# Altium integrated library Connectors.IntLib: 512 symbols (part 2 of 2)
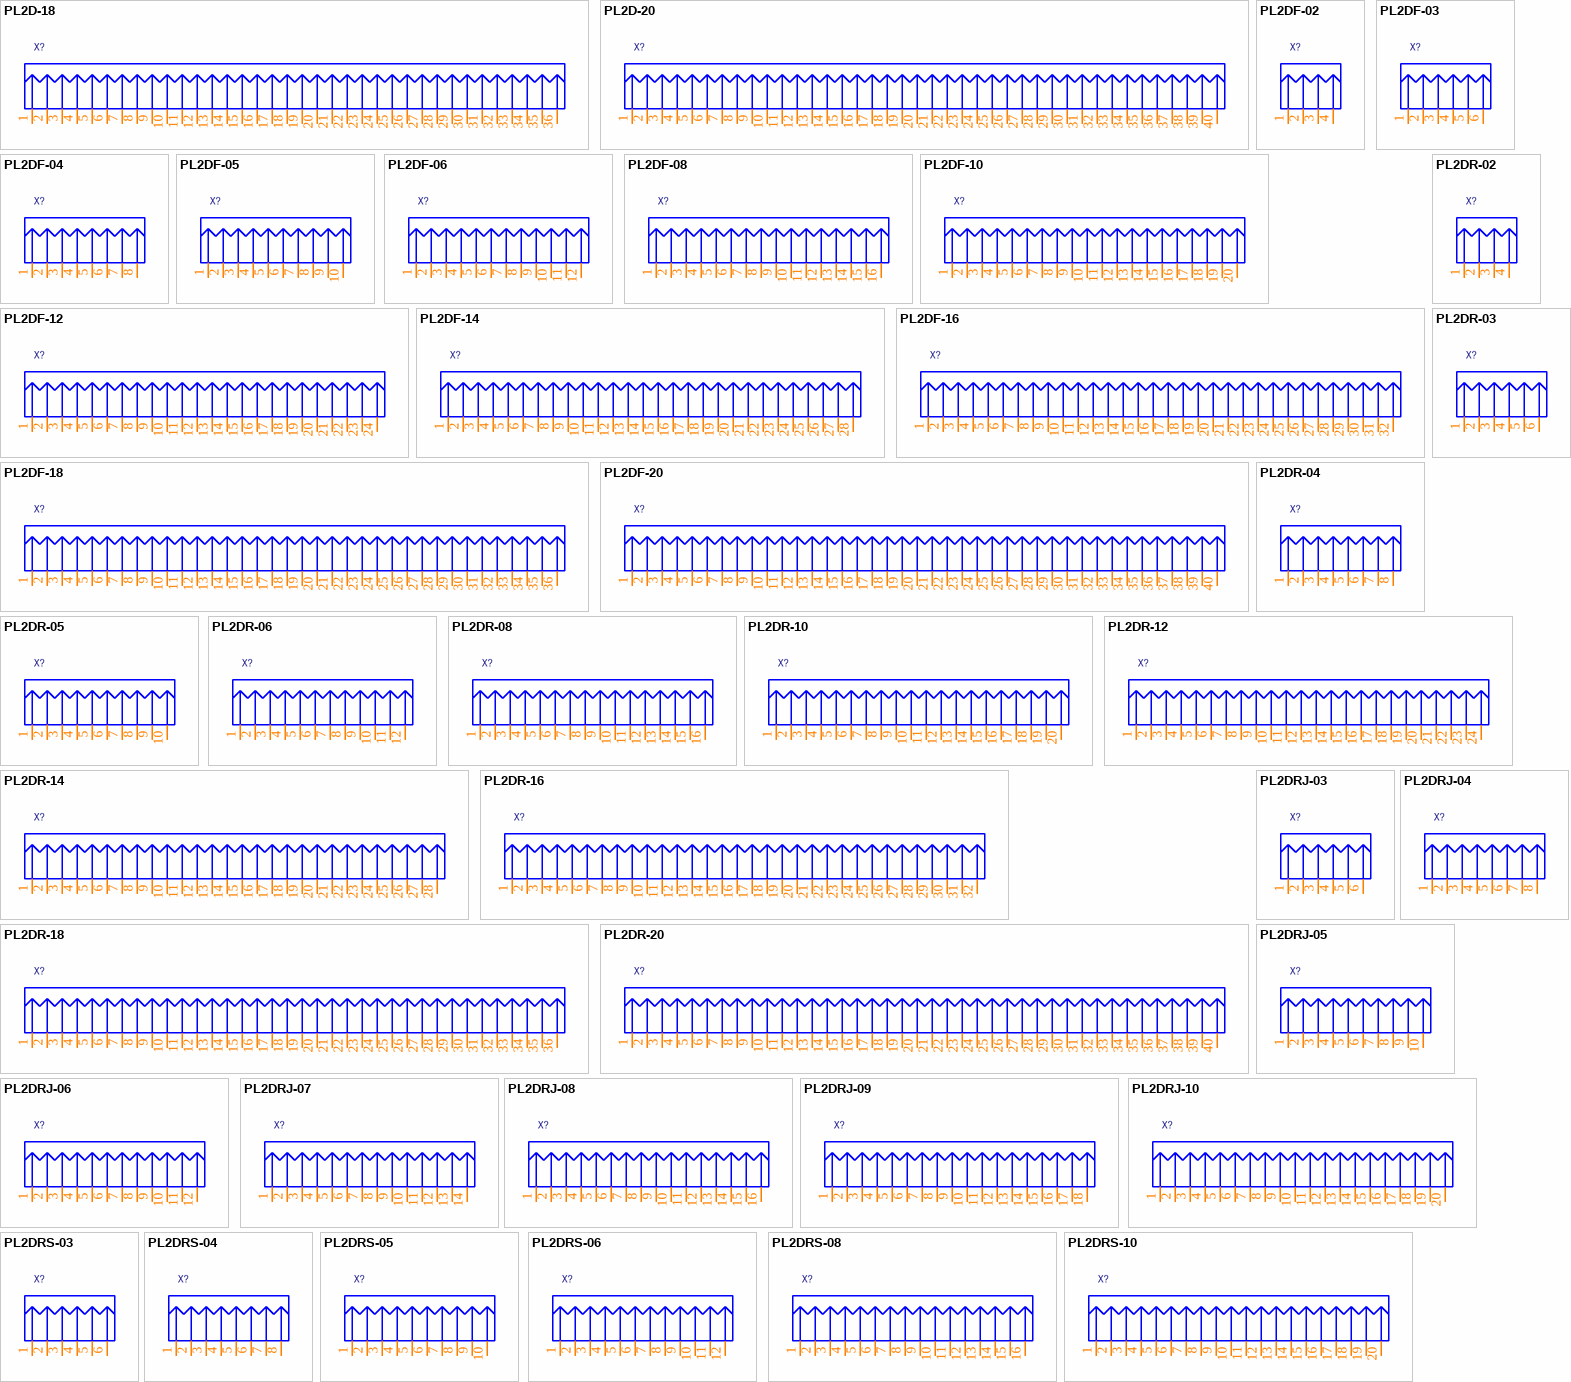
[diagram p14: symbols PL2D-18 to PL2DRS-10]

## PL2DRS-08
designator X?  (value not drawn)
2.0 mm; Note: Connector; Temp.Characteristic: -40C to +85C; Publisher: Catcatcat Electronics; Manufacturer: http://www.jinlingdz.com; Website developer: http://catcatcat.d-lan.dp.ua/; Assembly type: Manual Part
footprint PL2DRS-08 (2.00 mm)
pins: 1, 2, 3, 4, 5, 6, 7, 8, 9, 10, 11, 12, 13, 14, 15, 16

## PL2DRS-10
designator X?  (value not drawn)
2.0 mm; Note: Connector; Temp.Characteristic: -40C to +85C; Publisher: Catcatcat Electronics; Manufacturer: http://www.jinlingdz.com; Website developer: http://catcatcat.d-lan.dp.ua/; Assembly type: Manual Part
footprint PL2DRS-10 (2.00 mm)
pins: 1, 2, 3, 4, 5, 6, 7, 8, 9, 10, 11, 12, 13, 14, 15, 16, 17, 18, 19, 20

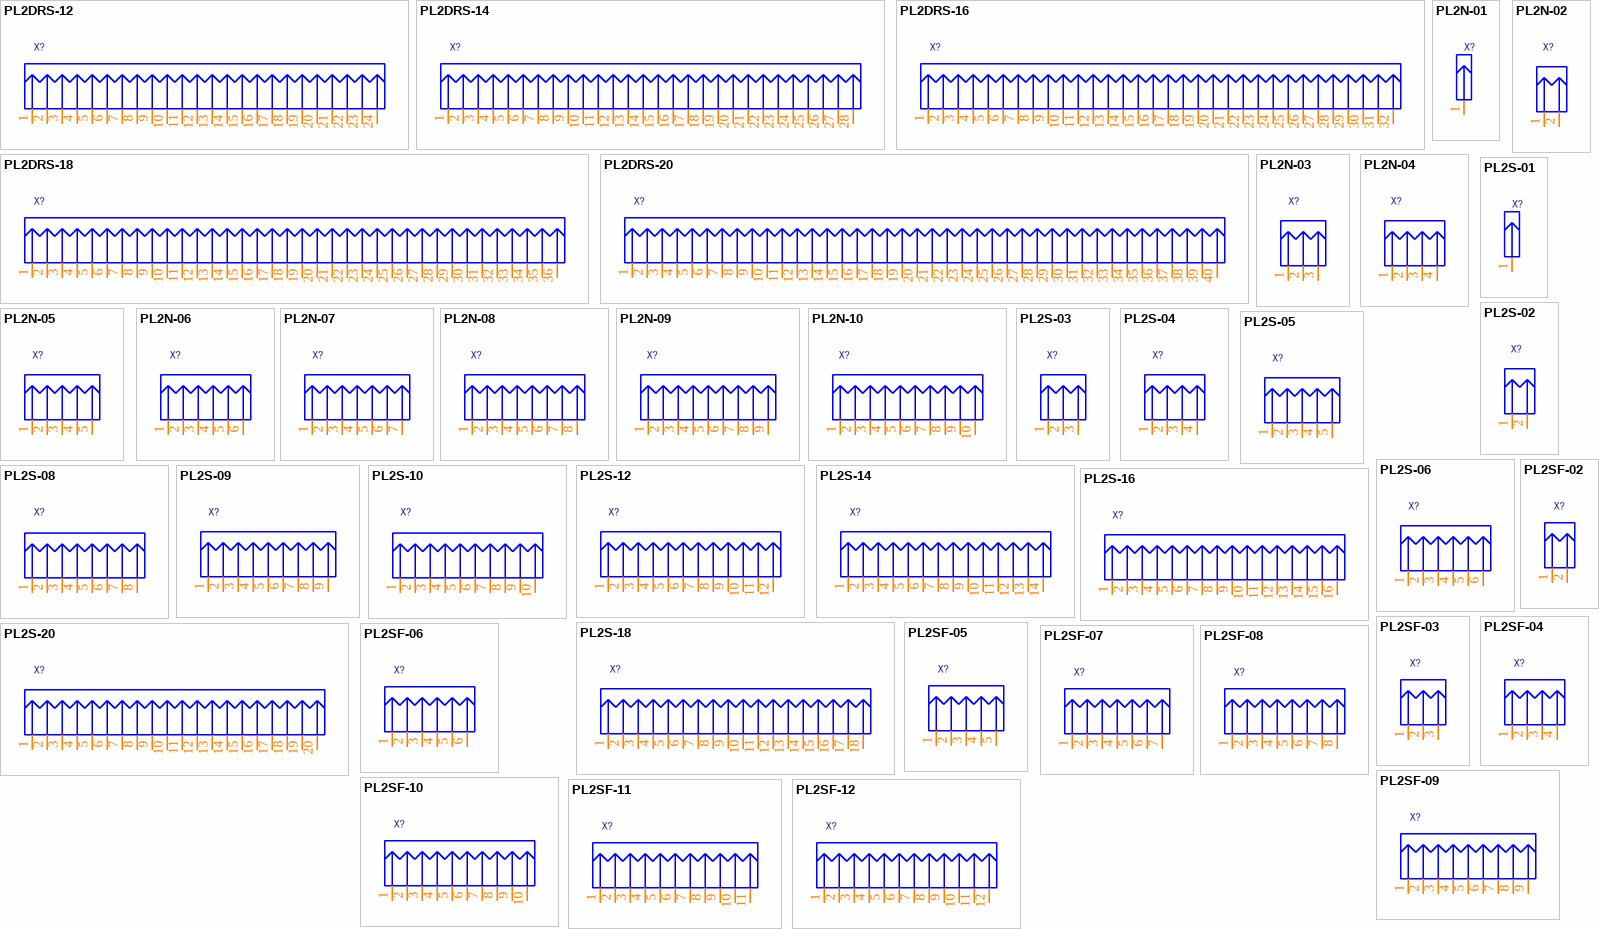
[diagram p7: symbols PL2DRS-12 to PL2SF-12]

## PL2DRS-12
designator X?  (value not drawn)
2.0 mm; Note: Connector; Temp.Characteristic: -40C to +85C; Publisher: Catcatcat Electronics; Manufacturer: http://www.jinlingdz.com; Website developer: http://catcatcat.d-lan.dp.ua/; Assembly type: Manual Part
footprint PL2DRS-12 (2.00 mm)
pins: 1, 2, 3, 4, 5, 6, 7, 8, 9, 10, 11, 12, 13, 14, 15, 16, 17, 18, 19, 20, 21, 22, 23, 24

## PL2DRS-14
designator X?  (value not drawn)
2.0 mm; Note: Connector; Temp.Characteristic: -40C to +85C; Publisher: Catcatcat Electronics; Manufacturer: http://www.jinlingdz.com; Website developer: http://catcatcat.d-lan.dp.ua/; Assembly type: Manual Part
footprint PL2DRS-14 (2.00 mm)
pins: 1, 2, 3, 4, 5, 6, 7, 8, 9, 10, 11, 12, 13, 14, 15, 16, 17, 18, 19, 20, 21, 22, 23, 24, 25, 26, 27, 28

## PL2DRS-16
designator X?  (value not drawn)
2.0 mm; Note: Connector; Temp.Characteristic: -40C to +85C; Publisher: Catcatcat Electronics; Manufacturer: http://www.jinlingdz.com; Website developer: http://catcatcat.d-lan.dp.ua/; Assembly type: Manual Part
footprint PL2DRS-16 (2.00 mm)
pins: 1, 2, 3, 4, 5, 6, 7, 8, 9, 10, 11, 12, 13, 14, 15, 16, 17, 18, 19, 20, 21, 22, 23, 24, 25, 26, 27, 28, 29, 30, 31, 32

## PL2DRS-18
designator X?  (value not drawn)
2.0 mm; Note: Connector; Temp.Characteristic: -40C to +85C; Publisher: Catcatcat Electronics; Manufacturer: http://www.jinlingdz.com; Website developer: http://catcatcat.d-lan.dp.ua/; Assembly type: Manual Part
footprint PL2DRS-18 (2.00 mm)
pins: 1, 2, 3, 4, 5, 6, 7, 8, 9, 10, 11, 12, 13, 14, 15, 16, 17, 18, 19, 20, 21, 22, 23, 24, 25, 26, 27, 28, 29, 30, 31, 32, 33, 34, 35, 36

## PL2DRS-20
designator X?  (value not drawn)
2.0 mm; Note: Connector; Temp.Characteristic: -40C to +85C; Publisher: Catcatcat Electronics; Manufacturer: http://www.jinlingdz.com; Website developer: http://catcatcat.d-lan.dp.ua/; Assembly type: Manual Part
footprint PL2DRS-20 (2.00 mm)
pins: 1, 2, 3, 4, 5, 6, 7, 8, 9, 10, 11, 12, 13, 14, 15, 16, 17, 18, 19, 20, 21, 22, 23, 24, 25, 26, 27, 28, 29, 30, 31, 32, 33, 34, 35, 36, 37, 38, 39, 40

## PL2N-01
designator X?  (value not drawn)
2.0 mm; Value: 5*2mm; Pricing Аlternative: 0; Note: Connector; Temp.Characteristic: -40C to +85C; Pricing Digi-Key: 0; Publisher: Catcatcat Electronics; Manufacturer: http://www.jinlingdz.com; Website developer: http://catcatcat.d-lan.dp.ua/; Assembly type: Manual Part
footprint PL2N-01 (2.00 mm)
pins: 1

## PL2N-02
designator X?  (value not drawn)
2.0 mm; Value: 5*2mm; Pricing Аlternative: 0; Note: Connector; Temp.Characteristic: -40C to +85C; Pricing Digi-Key: 0; Publisher: Catcatcat Electronics; Manufacturer: http://www.jinlingdz.com; Website developer: http://catcatcat.d-lan.dp.ua/; Assembly type: Manual Part
footprint PL2N-02 (2.00 mm)
pins: 1, 2

## PL2N-03
designator X?  (value not drawn)
2.0 mm; Value: 5*2mm; Pricing Аlternative: 0; Note: Connector; Temp.Characteristic: -40C to +85C; Pricing Digi-Key: 0; Publisher: Catcatcat Electronics; Manufacturer: http://www.jinlingdz.com; Website developer: http://catcatcat.d-lan.dp.ua/; Assembly type: Manual Part
footprint PL2N-03 (2.00 mm)
pins: 1, 2, 3

## PL2N-04
designator X?  (value not drawn)
2.0 mm; Value: 5*2mm; Pricing Аlternative: 0; Note: Connector; Temp.Characteristic: -40C to +85C; Pricing Digi-Key: 0; Publisher: Catcatcat Electronics; Manufacturer: http://www.jinlingdz.com; Website developer: http://catcatcat.d-lan.dp.ua/; Assembly type: Manual Part
footprint PL2N-05 (2.00 mm)
pins: 1, 2, 3, 4

## PL2N-05
designator X?  (value not drawn)
2.0 mm; Value: 5*2mm; Pricing Аlternative: 0; Note: Connector; Temp.Characteristic: -40C to +85C; Pricing Digi-Key: 0; Publisher: Catcatcat Electronics; Manufacturer: http://www.jinlingdz.com; Website developer: http://catcatcat.d-lan.dp.ua/; Assembly type: Manual Part
footprint PL2N-05 (2.00 mm)
pins: 1, 2, 3, 4, 5

## PL2N-06
designator X?  (value not drawn)
2.0 mm; Note: Connector; Temp.Characteristic: -40C to +85C; Publisher: Catcatcat Electronics; Manufacturer: http://www.jinlingdz.com; Website developer: http://catcatcat.d-lan.dp.ua/; Assembly type: Manual Part
footprint PL2N-06 (2.00 mm)
pins: 1, 2, 3, 4, 5, 6

## PL2N-07
designator X?  (value not drawn)
2.0 mm; Note: Connector; Temp.Characteristic: -40C to +85C; Publisher: Catcatcat Electronics; Manufacturer: http://www.jinlingdz.com; Website developer: http://catcatcat.d-lan.dp.ua/; Assembly type: Manual Part
footprint PL2N-07 (2.00 mm)
pins: 1, 2, 3, 4, 5, 6, 7

## PL2N-08
designator X?  (value not drawn)
2.0 mm; Note: Connector; Temp.Characteristic: -40C to +85C; Publisher: Catcatcat Electronics; Manufacturer: http://www.jinlingdz.com; Website developer: http://catcatcat.d-lan.dp.ua/; Assembly type: Manual Part
footprint PL2N-08 (2.00 mm)
pins: 1, 2, 3, 4, 5, 6, 7, 8

## PL2N-09
designator X?  (value not drawn)
2.0 mm; Note: Connector; Temp.Characteristic: -40C to +85C; Publisher: Catcatcat Electronics; Manufacturer: http://www.jinlingdz.com; Website developer: http://catcatcat.d-lan.dp.ua/; Assembly type: Manual Part
footprint PL2N-09 (2.00 mm)
pins: 1, 2, 3, 4, 5, 6, 7, 8, 9

## PL2N-10
designator X?  (value not drawn)
2.0 mm; Note: Connector; Temp.Characteristic: -40C to +85C; Publisher: Catcatcat Electronics; Manufacturer: http://www.jinlingdz.com; Website developer: http://catcatcat.d-lan.dp.ua/; Assembly type: Manual Part
footprint PL2N-10 (2.00 mm)
pins: 1, 2, 3, 4, 5, 6, 7, 8, 9, 10

## PL2S-01
designator X?  (value not drawn)
2.0 mm; Value: 5*2mm; Pricing Аlternative: 0; Note: Connector; Temp.Characteristic: -40C to +85C; Pricing Digi-Key: 0; Publisher: Catcatcat Electronics; Manufacturer: http://www.jinlingdz.com; Website developer: http://catcatcat.d-lan.dp.ua/; Assembly type: Manual Part
footprint PL2S-01 (2.00 mm)
pins: 1

## PL2S-02
designator X?  (value not drawn)
2.0 mm; Value: 5*2mm; Pricing Аlternative: 0; Note: Connector; Temp.Characteristic: -40C to +85C; Pricing Digi-Key: 0; Publisher: Catcatcat Electronics; Manufacturer: http://www.jinlingdz.com; Website developer: http://catcatcat.d-lan.dp.ua/; Assembly type: Manual Part
footprint PL2S-02 (2.00 mm)
pins: 1, 2

## PL2S-03
designator X?  (value not drawn)
2.0 mm; Value: 5*2mm; Pricing Аlternative: 0; Note: Connector; Temp.Characteristic: -40C to +85C; Pricing Digi-Key: 0; Publisher: Catcatcat Electronics; Manufacturer: http://www.jinlingdz.com; Website developer: http://catcatcat.d-lan.dp.ua/; Assembly type: Manual Part
footprint PL2S-03 (2.00 mm)
pins: 1, 2, 3

## PL2S-04
designator X?  (value not drawn)
2.0 mm; Value: 5*2mm; Pricing Аlternative: 0; Note: Connector; Temp.Characteristic: -40C to +85C; Pricing Digi-Key: 0; Publisher: Catcatcat Electronics; Manufacturer: http://www.jinlingdz.com; Website developer: http://catcatcat.d-lan.dp.ua/; Assembly type: Manual Part
footprint PL2S-04 (2.00 mm)
pins: 1, 2, 3, 4

## PL2S-05
designator X?  (value not drawn)
2.0 mm; Value: 5*2mm; Pricing Аlternative: 0; Note: Connector; Temp.Characteristic: -40C to +85C; Pricing Digi-Key: 0; Publisher: Catcatcat Electronics; Manufacturer: http://www.jinlingdz.com; Website developer: http://catcatcat.d-lan.dp.ua/; Assembly type: Manual Part
footprint PL2S-05 (2.00 mm)
pins: 1, 2, 3, 4, 5

## PL2S-06
designator X?  (value not drawn)
2.0 mm; Note: Connector; Temp.Characteristic: -40C to +85C; Publisher: Catcatcat Electronics; Manufacturer: http://www.jinlingdz.com; Website developer: http://catcatcat.d-lan.dp.ua/; Assembly type: Manual Part
footprint PL2S-06 (2.00 mm)
pins: 1, 2, 3, 4, 5, 6

## PL2S-08
designator X?  (value not drawn)
2.0 mm; Note: Connector; Temp.Characteristic: -40C to +85C; Publisher: Catcatcat Electronics; Manufacturer: http://www.jinlingdz.com; Website developer: http://catcatcat.d-lan.dp.ua/; Assembly type: Manual Part
footprint PL2S-08 (2.00 mm)
pins: 1, 2, 3, 4, 5, 6, 7, 8

## PL2S-09
designator X?  (value not drawn)
2.0 mm; Note: Connector; Temp.Characteristic: -40C to +85C; Publisher: Catcatcat Electronics; Manufacturer: http://www.jinlingdz.com; Website developer: http://catcatcat.d-lan.dp.ua/; Assembly type: Manual Part
footprint PL2S-09 (2.00 mm)
pins: 1, 2, 3, 4, 5, 6, 7, 8, 9

## PL2S-10
designator X?  (value not drawn)
2.0 mm; Note: Connector; Temp.Characteristic: -40C to +85C; Publisher: Catcatcat Electronics; Manufacturer: http://www.jinlingdz.com; Website developer: http://catcatcat.d-lan.dp.ua/; Assembly type: Manual Part
footprint PL2S-10 (2.00 mm)
pins: 1, 2, 3, 4, 5, 6, 7, 8, 9, 10

## PL2S-12
designator X?  (value not drawn)
2.0 mm; Note: Connector; Temp.Characteristic: -40C to +85C; Publisher: Catcatcat Electronics; Manufacturer: http://www.jinlingdz.com; Website developer: http://catcatcat.d-lan.dp.ua/; Assembly type: Manual Part
footprint PL2S-12 (2.00 mm)
pins: 1, 2, 3, 4, 5, 6, 7, 8, 9, 10, 11, 12

## PL2S-14
designator X?  (value not drawn)
2.0 mm; Note: Connector; Temp.Characteristic: -40C to +85C; Publisher: Catcatcat Electronics; Manufacturer: http://www.jinlingdz.com; Website developer: http://catcatcat.d-lan.dp.ua/; Assembly type: Manual Part
footprint PL2S-14 (2.00 mm)
pins: 1, 2, 3, 4, 5, 6, 7, 8, 9, 10, 11, 12, 13, 14

## PL2S-16
designator X?  (value not drawn)
2.0 mm; Note: Connector; Temp.Characteristic: -40C to +85C; Publisher: Catcatcat Electronics; Manufacturer: http://www.jinlingdz.com; Website developer: http://catcatcat.d-lan.dp.ua/; Assembly type: Manual Part
footprint PL2S-16 (2.00 mm)
pins: 1, 2, 3, 4, 5, 6, 7, 8, 9, 10, 11, 12, 13, 14, 15, 16

## PL2S-18
designator X?  (value not drawn)
2.0 mm; Note: Connector; Temp.Characteristic: -40C to +85C; Publisher: Catcatcat Electronics; Manufacturer: http://www.jinlingdz.com; Website developer: http://catcatcat.d-lan.dp.ua/; Assembly type: Manual Part
footprint PL2S-18 (2.00 mm)
pins: 1, 2, 3, 4, 5, 6, 7, 8, 9, 10, 11, 12, 13, 14, 15, 16, 17, 18

## PL2S-20
designator X?  (value not drawn)
2.0 mm; Note: Connector; Temp.Characteristic: -40C to +85C; Publisher: Catcatcat Electronics; Manufacturer: http://www.jinlingdz.com; Website developer: http://catcatcat.d-lan.dp.ua/; Assembly type: Manual Part
footprint PL2S-20 (2.00 mm)
pins: 1, 2, 3, 4, 5, 6, 7, 8, 9, 10, 11, 12, 13, 14, 15, 16, 17, 18, 19, 20

## PL2SF-02
designator X?  (value not drawn)
2.0 mm; Value: 5*2mm; Pricing Аlternative: 0; Note: Connector; Temp.Characteristic: -40C to +85C; Pricing Digi-Key: 0; Publisher: Catcatcat Electronics; Manufacturer: http://www.jinlingdz.com; Website developer: http://catcatcat.d-lan.dp.ua/; Assembly type: Manual Part
footprint PL2SF-02 (2.00 mm)
pins: 1, 2

## PL2SF-03
designator X?  (value not drawn)
2.0 mm; Value: 5*2mm; Pricing Аlternative: 0; Note: Connector; Temp.Characteristic: -40C to +85C; Pricing Digi-Key: 0; Publisher: Catcatcat Electronics; Manufacturer: http://www.jinlingdz.com; Website developer: http://catcatcat.d-lan.dp.ua/; Assembly type: Manual Part
footprint PL2SF-03 (2.00 mm)
pins: 1, 2, 3

## PL2SF-04
designator X?  (value not drawn)
2.0 mm; Value: 5*2mm; Pricing Аlternative: 0; Note: Connector; Temp.Characteristic: -40C to +85C; Pricing Digi-Key: 0; Publisher: Catcatcat Electronics; Manufacturer: http://www.jinlingdz.com; Website developer: http://catcatcat.d-lan.dp.ua/; Assembly type: Manual Part
footprint PL2SF-04 (2.00 mm)
pins: 1, 2, 3, 4

## PL2SF-05
designator X?  (value not drawn)
2.0 mm; Value: 5*2mm; Pricing Аlternative: 0; Note: Connector; Temp.Characteristic: -40C to +85C; Pricing Digi-Key: 0; Publisher: Catcatcat Electronics; Manufacturer: http://www.jinlingdz.com; Website developer: http://catcatcat.d-lan.dp.ua/; Assembly type: Manual Part
footprint PL2SF-05 (2.00 mm)
pins: 1, 2, 3, 4, 5

## PL2SF-06
designator X?  (value not drawn)
2.0 mm; Note: Connector; Temp.Characteristic: -40C to +85C; Publisher: Catcatcat Electronics; Manufacturer: http://www.jinlingdz.com; Website developer: http://catcatcat.d-lan.dp.ua/; Assembly type: Manual Part
footprint PL2SF-06 (2.00 mm)
pins: 1, 2, 3, 4, 5, 6

## PL2SF-07
designator X?  (value not drawn)
2.0 mm; Note: Connector; Temp.Characteristic: -40C to +85C; Publisher: Catcatcat Electronics; Manufacturer: http://www.jinlingdz.com; Website developer: http://catcatcat.d-lan.dp.ua/; Assembly type: Manual Part
footprint PL2SF-07 (2.00 mm)
pins: 1, 2, 3, 4, 5, 6, 7

## PL2SF-08
designator X?  (value not drawn)
2.0 mm; Note: Connector; Temp.Characteristic: -40C to +85C; Publisher: Catcatcat Electronics; Manufacturer: http://www.jinlingdz.com; Website developer: http://catcatcat.d-lan.dp.ua/; Assembly type: Manual Part
footprint PL2SF-08 (2.00 mm)
pins: 1, 2, 3, 4, 5, 6, 7, 8

## PL2SF-09
designator X?  (value not drawn)
2.0 mm; Note: Connector; Temp.Characteristic: -40C to +85C; Publisher: Catcatcat Electronics; Manufacturer: http://www.jinlingdz.com; Website developer: http://catcatcat.d-lan.dp.ua/; Assembly type: Manual Part
footprint PL2SF-09 (2.00 mm)
pins: 1, 2, 3, 4, 5, 6, 7, 8, 9

## PL2SF-10
designator X?  (value not drawn)
2.0 mm; Note: Connector; Temp.Characteristic: -40C to +85C; Publisher: Catcatcat Electronics; Manufacturer: http://www.jinlingdz.com; Website developer: http://catcatcat.d-lan.dp.ua/; Assembly type: Manual Part
footprint PL2SF-10 (2.00 mm)
pins: 1, 2, 3, 4, 5, 6, 7, 8, 9, 10

## PL2SF-11
designator X?  (value not drawn)
2.0 mm; Note: Connector; Temp.Characteristic: -40C to +85C; Publisher: Catcatcat Electronics; Manufacturer: http://www.jinlingdz.com; Website developer: http://catcatcat.d-lan.dp.ua/; Assembly type: Manual Part
footprint PL2SF-11 (2.00 mm)
pins: 1, 2, 3, 4, 5, 6, 7, 8, 9, 10, 11

## PL2SF-12
designator X?  (value not drawn)
2.0 mm; Note: Connector; Temp.Characteristic: -40C to +85C; Publisher: Catcatcat Electronics; Manufacturer: http://www.jinlingdz.com; Website developer: http://catcatcat.d-lan.dp.ua/; Assembly type: Manual Part
footprint PL2SF-12 (2.00 mm)
pins: 1, 2, 3, 4, 5, 6, 7, 8, 9, 10, 11, 12

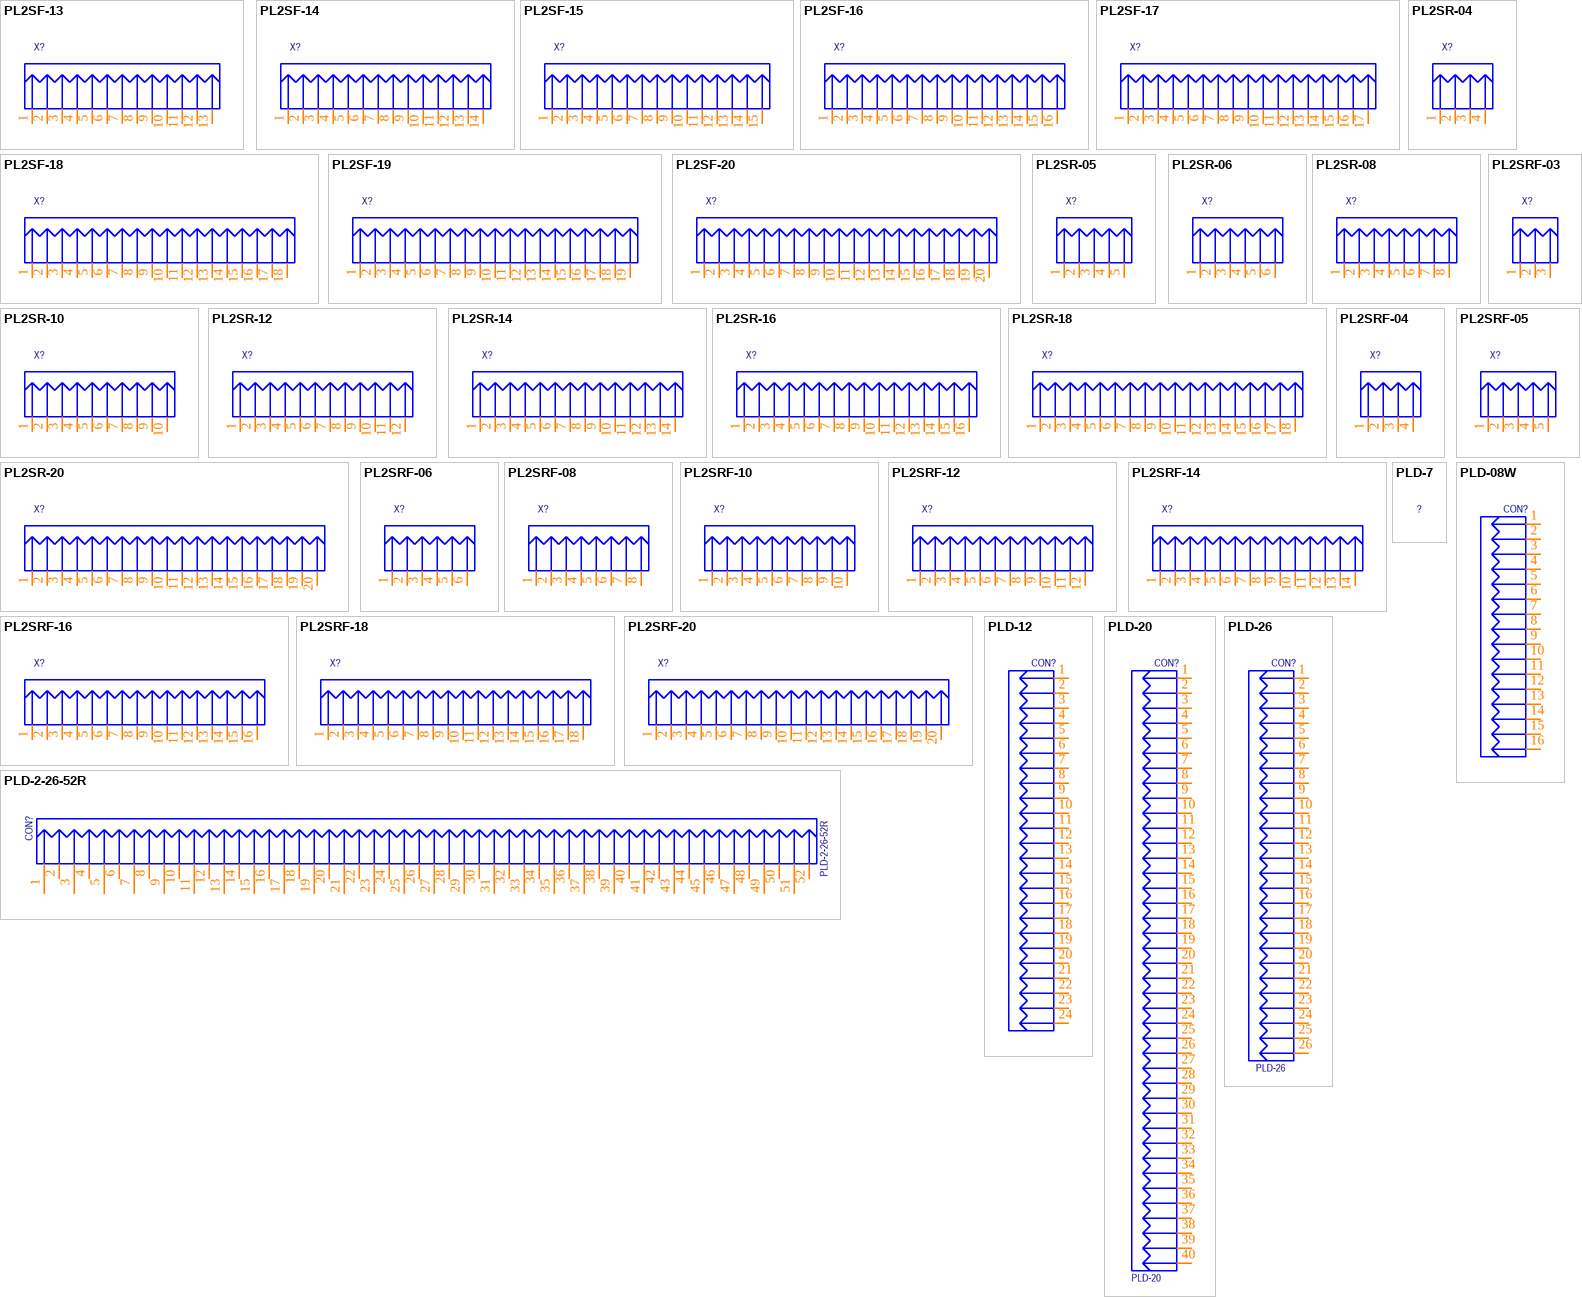
[diagram p8: symbols PL2SF-13 to PLD-26]

## PL2SF-13
designator X?  (value not drawn)
2.0 mm; Note: Connector; Temp.Characteristic: -40C to +85C; Publisher: Catcatcat Electronics; Manufacturer: http://www.jinlingdz.com; Website developer: http://catcatcat.d-lan.dp.ua/; Assembly type: Manual Part
footprint PL2SF-13 (2.00 mm)
pins: 1, 2, 3, 4, 5, 6, 7, 8, 9, 10, 11, 12, 13

## PL2SF-14
designator X?  (value not drawn)
2.0 mm; Note: Connector; Temp.Characteristic: -40C to +85C; Publisher: Catcatcat Electronics; Manufacturer: http://www.jinlingdz.com; Website developer: http://catcatcat.d-lan.dp.ua/; Assembly type: Manual Part
footprint PL2SF-14 (2.00 mm)
pins: 1, 2, 3, 4, 5, 6, 7, 8, 9, 10, 11, 12, 13, 14

## PL2SF-15
designator X?  (value not drawn)
2.0 mm; Note: Connector; Temp.Characteristic: -40C to +85C; Publisher: Catcatcat Electronics; Manufacturer: http://www.jinlingdz.com; Website developer: http://catcatcat.d-lan.dp.ua/; Assembly type: Manual Part
footprint PL2SF-15 (2.00 mm)
pins: 1, 2, 3, 4, 5, 6, 7, 8, 9, 10, 11, 12, 13, 14, 15

## PL2SF-16
designator X?  (value not drawn)
2.0 mm; Note: Connector; Temp.Characteristic: -40C to +85C; Publisher: Catcatcat Electronics; Manufacturer: http://www.jinlingdz.com; Website developer: http://catcatcat.d-lan.dp.ua/; Assembly type: Manual Part
footprint PL2SF-16 (2.00 mm)
pins: 1, 2, 3, 4, 5, 6, 7, 8, 9, 10, 11, 12, 13, 14, 15, 16

## PL2SF-17
designator X?  (value not drawn)
2.0 mm; Note: Connector; Temp.Characteristic: -40C to +85C; Publisher: Catcatcat Electronics; Manufacturer: http://www.jinlingdz.com; Website developer: http://catcatcat.d-lan.dp.ua/; Assembly type: Manual Part
footprint PL2SF-17 (2.00 mm)
pins: 1, 2, 3, 4, 5, 6, 7, 8, 9, 10, 11, 12, 13, 14, 15, 16, 17

## PL2SF-18
designator X?  (value not drawn)
2.0 mm; Note: Connector; Temp.Characteristic: -40C to +85C; Publisher: Catcatcat Electronics; Manufacturer: http://www.jinlingdz.com; Website developer: http://catcatcat.d-lan.dp.ua/; Assembly type: Manual Part
footprint PL2SF-18 (2.00 mm)
pins: 1, 2, 3, 4, 5, 6, 7, 8, 9, 10, 11, 12, 13, 14, 15, 16, 17, 18

## PL2SF-19
designator X?  (value not drawn)
2.0 mm; Note: Connector; Temp.Characteristic: -40C to +85C; Publisher: Catcatcat Electronics; Manufacturer: http://www.jinlingdz.com; Website developer: http://catcatcat.d-lan.dp.ua/; Assembly type: Manual Part
footprint PL2SF-19 (2.00 mm)
pins: 1, 2, 3, 4, 5, 6, 7, 8, 9, 10, 11, 12, 13, 14, 15, 16, 17, 18, 19

## PL2SF-20
designator X?  (value not drawn)
2.0 mm; Note: Connector; Temp.Characteristic: -40C to +85C; Publisher: Catcatcat Electronics; Manufacturer: http://www.jinlingdz.com; Website developer: http://catcatcat.d-lan.dp.ua/; Assembly type: Manual Part
footprint PL2SF-20 (2.00 mm)
pins: 1, 2, 3, 4, 5, 6, 7, 8, 9, 10, 11, 12, 13, 14, 15, 16, 17, 18, 19, 20

## PL2SR-04
designator X?  (value not drawn)
2.0 mm; Value: 5*2mm; Pricing Аlternative: 0; Note: Connector; Temp.Characteristic: -40C to +85C; Pricing Digi-Key: 0; Publisher: Catcatcat Electronics; Manufacturer: http://www.jinlingdz.com; Website developer: http://catcatcat.d-lan.dp.ua/; Assembly type: Manual Part
footprint PL2SR-04 (2.00 mm)
pins: 1, 2, 3, 4

## PL2SR-05
designator X?  (value not drawn)
2.0 mm; Value: 5*2mm; Pricing Аlternative: 0; Note: Connector; Temp.Characteristic: -40C to +85C; Pricing Digi-Key: 0; Publisher: Catcatcat Electronics; Manufacturer: http://www.jinlingdz.com; Website developer: http://catcatcat.d-lan.dp.ua/; Assembly type: Manual Part
footprint PL2SR-05 (2.00 mm)
pins: 1, 2, 3, 4, 5

## PL2SR-06
designator X?  (value not drawn)
2.0 mm; Note: Connector; Temp.Characteristic: -40C to +85C; Publisher: Catcatcat Electronics; Manufacturer: http://www.jinlingdz.com; Website developer: http://catcatcat.d-lan.dp.ua/; Assembly type: Manual Part
footprint PL2SR-06 (2.00 mm)
pins: 1, 2, 3, 4, 5, 6

## PL2SR-08
designator X?  (value not drawn)
2.0 mm; Note: Connector; Temp.Characteristic: -40C to +85C; Publisher: Catcatcat Electronics; Manufacturer: http://www.jinlingdz.com; Website developer: http://catcatcat.d-lan.dp.ua/; Assembly type: Manual Part
footprint PL2SR-08 (2.00 mm)
pins: 1, 2, 3, 4, 5, 6, 7, 8

## PL2SR-10
designator X?  (value not drawn)
2.0 mm; Note: Connector; Temp.Characteristic: -40C to +85C; Publisher: Catcatcat Electronics; Manufacturer: http://www.jinlingdz.com; Website developer: http://catcatcat.d-lan.dp.ua/; Assembly type: Manual Part
footprint PL2SR-10 (2.00 mm)
pins: 1, 2, 3, 4, 5, 6, 7, 8, 9, 10

## PL2SR-12
designator X?  (value not drawn)
2.0 mm; Note: Connector; Temp.Characteristic: -40C to +85C; Publisher: Catcatcat Electronics; Manufacturer: http://www.jinlingdz.com; Website developer: http://catcatcat.d-lan.dp.ua/; Assembly type: Manual Part
footprint PL2SR-12 (2.00 mm)
pins: 1, 2, 3, 4, 5, 6, 7, 8, 9, 10, 11, 12

## PL2SR-14
designator X?  (value not drawn)
2.0 mm; Note: Connector; Temp.Characteristic: -40C to +85C; Publisher: Catcatcat Electronics; Manufacturer: http://www.jinlingdz.com; Website developer: http://catcatcat.d-lan.dp.ua/; Assembly type: Manual Part
footprint PL2SR-14 (2.00 mm)
pins: 1, 2, 3, 4, 5, 6, 7, 8, 9, 10, 11, 12, 13, 14

## PL2SR-16
designator X?  (value not drawn)
2.0 mm; Note: Connector; Temp.Characteristic: -40C to +85C; Publisher: Catcatcat Electronics; Manufacturer: http://www.jinlingdz.com; Website developer: http://catcatcat.d-lan.dp.ua/; Assembly type: Manual Part
footprint PL2SR-16 (2.00 mm)
pins: 1, 2, 3, 4, 5, 6, 7, 8, 9, 10, 11, 12, 13, 14, 15, 16

## PL2SR-18
designator X?  (value not drawn)
2.0 mm; Note: Connector; Temp.Characteristic: -40C to +85C; Publisher: Catcatcat Electronics; Manufacturer: http://www.jinlingdz.com; Website developer: http://catcatcat.d-lan.dp.ua/; Assembly type: Manual Part
footprint PL2SR-18 (2.00 mm)
pins: 1, 2, 3, 4, 5, 6, 7, 8, 9, 10, 11, 12, 13, 14, 15, 16, 17, 18

## PL2SR-20
designator X?  (value not drawn)
2.0 mm; Note: Connector; Temp.Characteristic: -40C to +85C; Publisher: Catcatcat Electronics; Manufacturer: http://www.jinlingdz.com; Website developer: http://catcatcat.d-lan.dp.ua/; Assembly type: Manual Part
footprint PL2SR-20 (2.00 mm)
pins: 1, 2, 3, 4, 5, 6, 7, 8, 9, 10, 11, 12, 13, 14, 15, 16, 17, 18, 19, 20

## PL2SRF-03
designator X?  (value not drawn)
2.0 mm; Value: 5*2mm; Pricing Аlternative: 0; Note: Connector; Temp.Characteristic: -40C to +85C; Pricing Digi-Key: 0; Publisher: Catcatcat Electronics; Manufacturer: http://www.jinlingdz.com; Website developer: http://catcatcat.d-lan.dp.ua/; Assembly type: Manual Part
footprint PL2SRF-03 (2.00 mm)
pins: 1, 2, 3

## PL2SRF-04
designator X?  (value not drawn)
2.0 mm; Value: 5*2mm; Pricing Аlternative: 0; Note: Connector; Temp.Characteristic: -40C to +85C; Pricing Digi-Key: 0; Publisher: Catcatcat Electronics; Manufacturer: http://www.jinlingdz.com; Website developer: http://catcatcat.d-lan.dp.ua/; Assembly type: Manual Part
footprint PL2SRF-04 (2.00 mm)
pins: 1, 2, 3, 4

## PL2SRF-05
designator X?  (value not drawn)
2.0 mm; Value: 5*2mm; Pricing Аlternative: 0; Note: Connector; Temp.Characteristic: -40C to +85C; Pricing Digi-Key: 0; Publisher: Catcatcat Electronics; Manufacturer: http://www.jinlingdz.com; Website developer: http://catcatcat.d-lan.dp.ua/; Assembly type: Manual Part
footprint PL2SRF-05 (2.00 mm)
pins: 1, 2, 3, 4, 5

## PL2SRF-06
designator X?  (value not drawn)
2.0 mm; Note: Connector; Temp.Characteristic: -40C to +85C; Publisher: Catcatcat Electronics; Manufacturer: http://www.jinlingdz.com; Website developer: http://catcatcat.d-lan.dp.ua/; Assembly type: Manual Part
footprint PL2SRF-06 (2.00 mm)
pins: 1, 2, 3, 4, 5, 6

## PL2SRF-08
designator X?  (value not drawn)
2.0 mm; Note: Connector; Temp.Characteristic: -40C to +85C; Publisher: Catcatcat Electronics; Manufacturer: http://www.jinlingdz.com; Website developer: http://catcatcat.d-lan.dp.ua/; Assembly type: Manual Part
footprint PL2SRF-08 (2.00 mm)
pins: 1, 2, 3, 4, 5, 6, 7, 8

## PL2SRF-10
designator X?  (value not drawn)
2.0 mm; Note: Connector; Temp.Characteristic: -40C to +85C; Publisher: Catcatcat Electronics; Manufacturer: http://www.jinlingdz.com; Website developer: http://catcatcat.d-lan.dp.ua/; Assembly type: Manual Part
footprint PL2SRF-10 (2.00 mm)
pins: 1, 2, 3, 4, 5, 6, 7, 8, 9, 10

## PL2SRF-12
designator X?  (value not drawn)
2.0 mm; Note: Connector; Temp.Characteristic: -40C to +85C; Publisher: Catcatcat Electronics; Manufacturer: http://www.jinlingdz.com; Website developer: http://catcatcat.d-lan.dp.ua/; Assembly type: Manual Part
footprint PL2SRF-12 (2.00 mm)
pins: 1, 2, 3, 4, 5, 6, 7, 8, 9, 10, 11, 12

## PL2SRF-14
designator X?  (value not drawn)
2.0 mm; Note: Connector; Temp.Characteristic: -40C to +85C; Publisher: Catcatcat Electronics; Manufacturer: http://www.jinlingdz.com; Website developer: http://catcatcat.d-lan.dp.ua/; Assembly type: Manual Part
footprint PL2SRF-14 (2.00 mm)
pins: 1, 2, 3, 4, 5, 6, 7, 8, 9, 10, 11, 12, 13, 14

## PL2SRF-16
designator X?  (value not drawn)
2.0 mm; Note: Connector; Temp.Characteristic: -40C to +85C; Publisher: Catcatcat Electronics; Manufacturer: http://www.jinlingdz.com; Website developer: http://catcatcat.d-lan.dp.ua/; Assembly type: Manual Part
footprint PL2SRF-16 (2.00 mm)
pins: 1, 2, 3, 4, 5, 6, 7, 8, 9, 10, 11, 12, 13, 14, 15, 16

## PL2SRF-18
designator X?  (value not drawn)
2.0 mm; Note: Connector; Temp.Characteristic: -40C to +85C; Publisher: Catcatcat Electronics; Manufacturer: http://www.jinlingdz.com; Website developer: http://catcatcat.d-lan.dp.ua/; Assembly type: Manual Part
footprint PL2SRF-18 (2.00 mm)
pins: 1, 2, 3, 4, 5, 6, 7, 8, 9, 10, 11, 12, 13, 14, 15, 16, 17, 18

## PL2SRF-20
designator X?  (value not drawn)
2.0 mm; Note: Connector; Temp.Characteristic: -40C to +85C; Publisher: Catcatcat Electronics; Manufacturer: http://www.jinlingdz.com; Website developer: http://catcatcat.d-lan.dp.ua/; Assembly type: Manual Part
footprint PL2SRF-20 (2.00 mm)
pins: 1, 2, 3, 4, 5, 6, 7, 8, 9, 10, 11, 12, 13, 14, 15, 16, 17, 18, 19, 20

## PLD-2-26-52R
designator CON?
Note: Connector; Temp.Characteristic: -40C to +85C; Value: *; Publisher: Catcatcat Electronics; Website developer: http://catcatcat.d-lan.dp.ua/; Assembly type: Manual Part
footprint PLD-2-26-52R
pins: 1, 2, 3, 4, 5, 6, 7, 8, 9, 10, 11, 12, 13, 14, 15, 16, 17, 18, 19, 20, 21, 22, 23, 24, 25, 26, 27, 28, 29, 30, 31, 32, 33, 34, 35, 36, 37, 38, 39, 40, 41, 42, 43, 44, 45, 46, 47, 48, 49, 50, 51, 52

## PLD-7
designator ?  (value not drawn)
Note: Connector; Temp.Characteristic: -40C to +85C; Value: *; Publisher: Catcatcat Electronics; Website developer: http://catcatcat.d-lan.dp.ua/; Assembly type: Manual Part
footprint PLD-7
pins: 1 hidden, 2 hidden, 3 hidden, 4 hidden, 5 hidden, 6 hidden, 7 hidden, 8 hidden, 9 hidden, 10 hidden, 11 hidden, 12 hidden, 13 hidden, 14 hidden

## PLD-08W
designator CON?  (value not drawn)
Note: Connector; Temp.Characteristic: -40C to +85C; Value: *; Publisher: Catcatcat Electronics; Website developer: http://catcatcat.d-lan.dp.ua/; Assembly type: Manual Part
footprint PLD-08W
pins: 1, 2, 3, 4, 5, 6, 7, 8, 9, 10, 11, 12, 13, 14, 15, 16

## PLD-12
designator CON?  (value not drawn)
Note: Connector; Temp.Characteristic: -40C to +85C; Value: *; Publisher: Catcatcat Electronics; Website developer: http://catcatcat.d-lan.dp.ua/; Assembly type: Manual Part
footprint PLD-12
pins: 1, 2, 3, 4, 5, 6, 7, 8, 9, 10, 11, 12, 13, 14, 15, 16, 17, 18, 19, 20, 21, 22, 23, 24

## PLD-20
designator CON?
Note: Connector; Temp.Characteristic: -40C to +85C; Value: *; Publisher: Catcatcat Electronics; Website developer: http://catcatcat.d-lan.dp.ua/; Assembly type: Manual Part
footprint PLD-20
pins: 1, 2, 3, 4, 5, 6, 7, 8, 9, 10, 11, 12, 13, 14, 15, 16, 17, 18, 19, 20, 21, 22, 23, 24, 25, 26, 27, 28, 29, 30, 31, 32, 33, 34, 35, 36, 37, 38, 39, 40

## PLD-26
designator CON?
Note: Connector; Temp.Characteristic: -40C to +85C; Value: *; Publisher: Catcatcat Electronics; Website developer: http://catcatcat.d-lan.dp.ua/; Assembly type: Manual Part
footprint PLD-26
pins: 1, 2, 3, 4, 5, 6, 7, 8, 9, 10, 11, 12, 13, 14, 15, 16, 17, 18, 19, 20, 21, 22, 23, 24, 25, 26

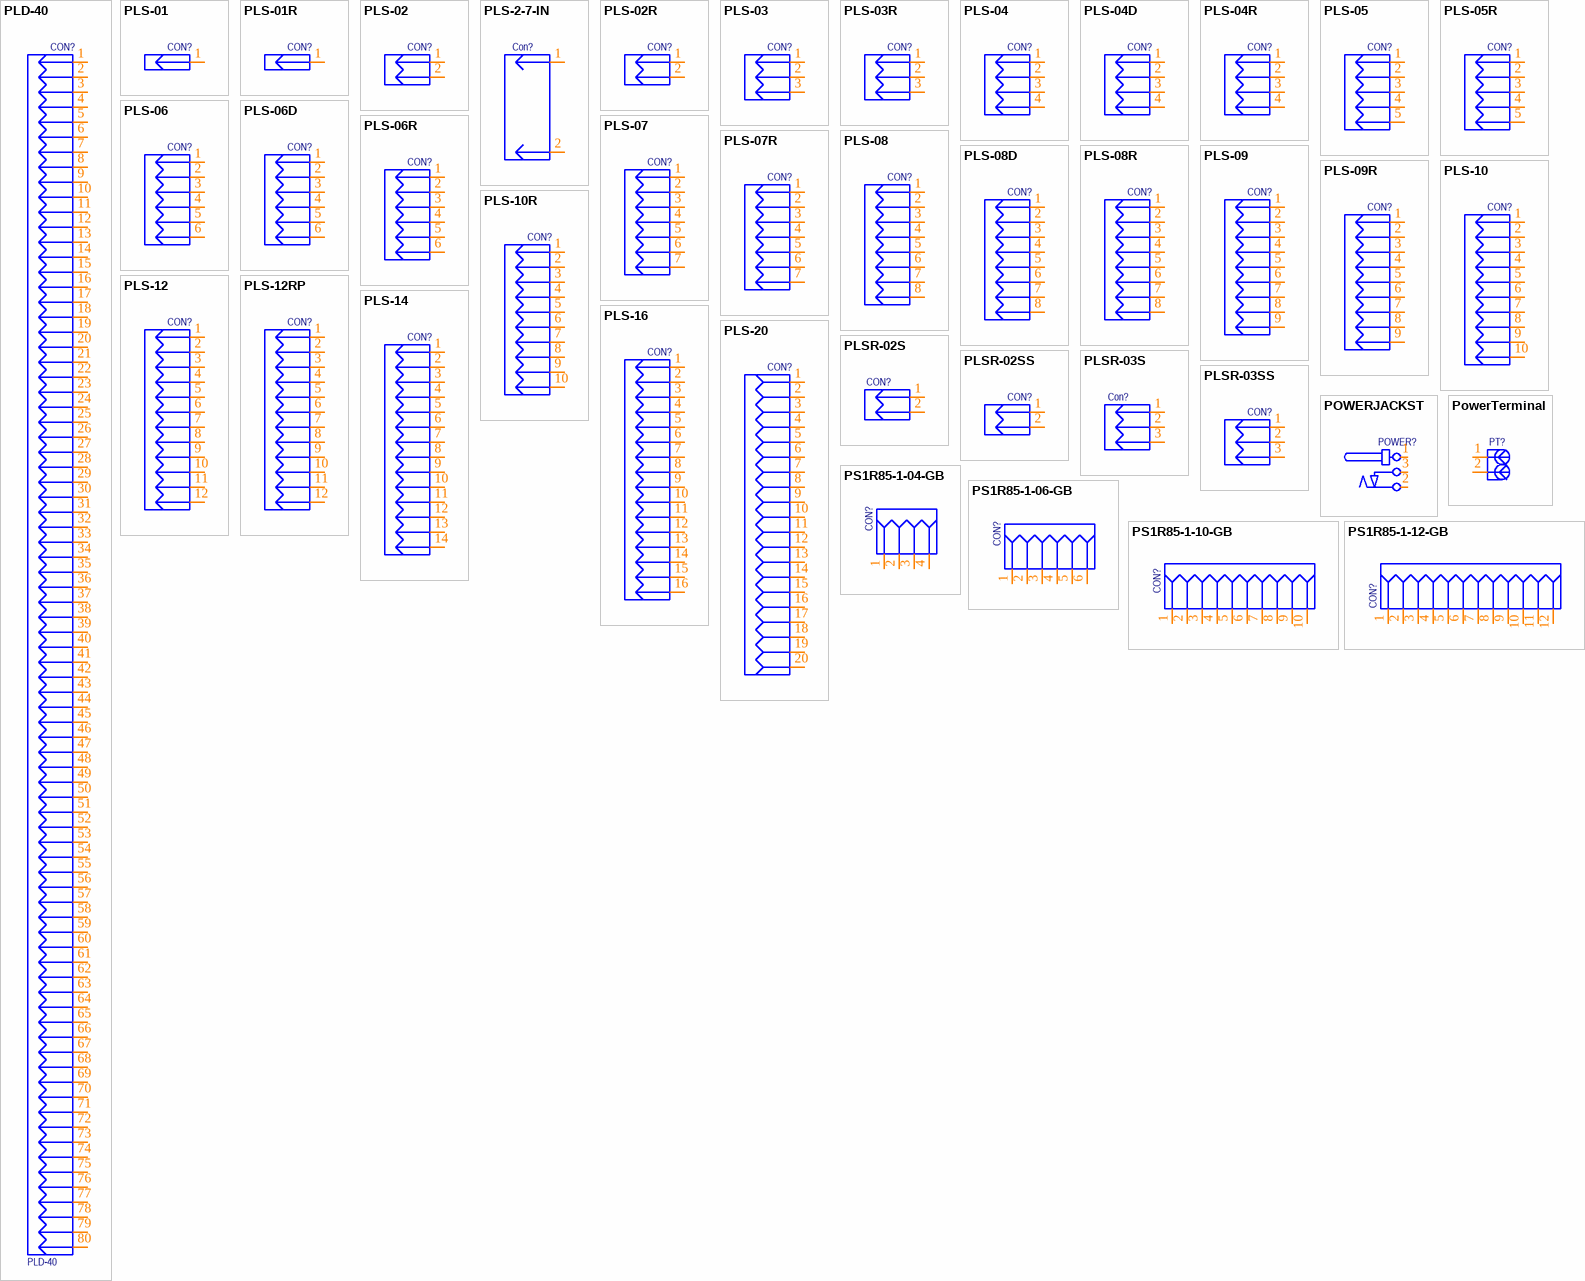
[diagram p9: symbols PLD-40 to PS1R85-1-12-GB]

## PLD-40
designator CON?
Note: Connector; Temp.Characteristic: -40C to +85C; Value: *; Publisher: Catcatcat Electronics; Website developer: http://catcatcat.d-lan.dp.ua/; Assembly type: Manual Part
footprint PLD-40
pins: 1, 2, 3, 4, 5, 6, 7, 8, 9, 10, 11, 12, 13, 14, 15, 16, 17, 18, 19, 20, 21, 22, 23, 24, 25, 26, 27, 28, 29, 30, 31, 32, 33, 34, 35, 36, 37, 38, 39, 40, 41, 42, 43, 44, 45, 46, 47, 48, 49, 50, 51, 52, 53, 54, 55, 56, 57, 58, 59, 60, 61, 62, 63, 64, 65, 66, 67, 68, 69, 70, 71, 72, 73, 74, 75, 76, 77, 78, 79, 80

## PLS-01
designator CON?  (value not drawn)
2.54 mm; Note: Connector; Temp.Characteristic: -40C to +85C; Value: *; Publisher: Catcatcat Electronics; Website developer: http://catcatcat.d-lan.dp.ua/; Assembly type: Manual Part
footprint PLS-01
pins: 1

## PLS-01R
designator CON?  (value not drawn)
2.54 mm; Note: Connector; Temp.Characteristic: -40C to +85C; Value: *; Publisher: Catcatcat Electronics; Website developer: http://catcatcat.d-lan.dp.ua/; Assembly type: Manual Part
footprint PLS-01R
pins: 1

## PLS-02
designator CON?  (value not drawn)
2.54 mm; Note: Connector; Temp.Characteristic: -40C to +85C; Value: *; Publisher: Catcatcat Electronics; Website developer: http://catcatcat.d-lan.dp.ua/; Assembly type: Manual Part
footprint PLS-02
pins: 1, 2

## PLS-2-7-IN
designator Con?  (value not drawn)
2.54 mm; Note: Connector; Temp.Characteristic: -40C to +85C; Value: *; Publisher: Catcatcat Electronics; Website developer: http://catcatcat.d-lan.dp.ua/; Assembly type: Manual Part
footprint PLSP-2-7-IN
pins: 1, 2

## PLS-02R
designator CON?  (value not drawn)
2.54 mm; Note: Connector; Temp.Characteristic: -40C to +85C; Value: *; Publisher: Catcatcat Electronics; Website developer: http://catcatcat.d-lan.dp.ua/; Assembly type: Manual Part
footprint PLS-02R
pins: 1, 2

## PLS-03
designator CON?  (value not drawn)
2.54 mm; Note: Connector; Temp.Characteristic: -40C to +85C; Value: *; Publisher: Catcatcat Electronics; Website developer: http://catcatcat.d-lan.dp.ua/; Assembly type: Manual Part
footprint PLS-03
pins: 1, 2, 3

## PLS-03R
designator CON?  (value not drawn)
2.54 mm; Note: Connector; Temp.Characteristic: -40C to +85C; Value: *; Publisher: Catcatcat Electronics; Website developer: http://catcatcat.d-lan.dp.ua/; Assembly type: Manual Part
footprint PLS-03R
pins: 1, 2, 3

## PLS-04
designator CON?  (value not drawn)
2.54 mm; Note: Connector; Temp.Characteristic: -40C to +85C; Value: *; Publisher: Catcatcat Electronics; Website developer: http://catcatcat.d-lan.dp.ua/; Assembly type: Manual Part
footprint PLS-04
pins: 1, 2, 3, 4

## PLS-04D
designator CON?  (value not drawn)
2.54 mm; Note: Connector; Temp.Characteristic: -40C to +85C; Value: *; Publisher: Catcatcat Electronics; Website developer: http://catcatcat.d-lan.dp.ua/; Assembly type: Manual Part
footprint PLS-04D
pins: 1, 2, 3, 4

## PLS-04R
designator CON?  (value not drawn)
2.54 mm; Note: Connector; Temp.Characteristic: -40C to +85C; Value: *; Publisher: Catcatcat Electronics; Website developer: http://catcatcat.d-lan.dp.ua/; Assembly type: Manual Part
footprint PLS-04R
pins: 1, 2, 3, 4

## PLS-05
designator CON?  (value not drawn)
2.54 mm; Note: Connector; Temp.Characteristic: -40C to +85C; Value: *; Publisher: Catcatcat Electronics; Website developer: http://catcatcat.d-lan.dp.ua/; Assembly type: Manual Part
footprint PLS-05
pins: 1, 2, 3, 4, 5

## PLS-05R
designator CON?  (value not drawn)
2.54 mm; Note: Connector; Temp.Characteristic: -40C to +85C; Value: *; Publisher: Catcatcat Electronics; Website developer: http://catcatcat.d-lan.dp.ua/; Assembly type: Manual Part
footprint PLS-05R
pins: 1, 2, 3, 4, 5

## PLS-06
designator CON?  (value not drawn)
2.54 mm; Note: Connector; Temp.Characteristic: -40C to +85C; Value: *; Publisher: Catcatcat Electronics; Website developer: http://catcatcat.d-lan.dp.ua/; Assembly type: Manual Part
footprint PLS-06
pins: 1, 2, 3, 4, 5, 6

## PLS-06D
designator CON?  (value not drawn)
2.54 mm; Note: Connector; Temp.Characteristic: -40C to +85C; Value: *; Publisher: Catcatcat Electronics; Website developer: http://catcatcat.d-lan.dp.ua/; Assembly type: Manual Part
footprint PLS-06D
pins: 1, 2, 3, 4, 5, 6

## PLS-06R
designator CON?  (value not drawn)
2.54 mm; Note: Connector; Temp.Characteristic: -40C to +85C; Value: *; Publisher: Catcatcat Electronics; Website developer: http://catcatcat.d-lan.dp.ua/; Assembly type: Manual Part
footprint PLS-06R
pins: 1, 2, 3, 4, 5, 6

## PLS-07
designator CON?  (value not drawn)
2.54 mm; Note: Connector; Temp.Characteristic: -40C to +85C; Value: *; Publisher: Catcatcat Electronics; Website developer: http://catcatcat.d-lan.dp.ua/; Assembly type: Manual Part
footprint PLS-07
pins: 1, 2, 3, 4, 5, 6, 7

## PLS-07R
designator CON?  (value not drawn)
2.54 mm; Note: Connector; Temp.Characteristic: -40C to +85C; Value: *; Publisher: Catcatcat Electronics; Website developer: http://catcatcat.d-lan.dp.ua/; Assembly type: Manual Part
footprint PLS-07R
pins: 1, 2, 3, 4, 5, 6, 7

## PLS-08
designator CON?  (value not drawn)
2.54 mm; Note: Connector; Temp.Characteristic: -40C to +85C; Value: *; Publisher: Catcatcat Electronics; Website developer: http://catcatcat.d-lan.dp.ua/; Assembly type: Manual Part
footprint PLS-08
pins: 1, 2, 3, 4, 5, 6, 7, 8

## PLS-08D
designator CON?  (value not drawn)
2.54 mm; Note: Connector; Temp.Characteristic: -40C to +85C; Value: *; Publisher: Catcatcat Electronics; Website developer: http://catcatcat.d-lan.dp.ua/; Assembly type: Manual Part
footprint PLS-08D
pins: 1, 2, 3, 4, 5, 6, 7, 8

## PLS-08R
designator CON?  (value not drawn)
2.54 mm; Note: Connector; Temp.Characteristic: -40C to +85C; Value: *; Publisher: Catcatcat Electronics; Website developer: http://catcatcat.d-lan.dp.ua/; Assembly type: Manual Part
footprint PLS-08R
pins: 1, 2, 3, 4, 5, 6, 7, 8

## PLS-09
designator CON?  (value not drawn)
2.54 mm; Note: Connector; Temp.Characteristic: -40C to +85C; Value: *; Publisher: Catcatcat Electronics; Website developer: http://catcatcat.d-lan.dp.ua/; Assembly type: Manual Part
footprint PLS-09
pins: 1, 2, 3, 4, 5, 6, 7, 8, 9

## PLS-09R
designator CON?  (value not drawn)
2.54 mm; Note: Connector; Temp.Characteristic: -40C to +85C; Value: *; Publisher: Catcatcat Electronics; Website developer: http://catcatcat.d-lan.dp.ua/; Assembly type: Manual Part
footprint PLS-09R
pins: 1, 2, 3, 4, 5, 6, 7, 8, 9

## PLS-10
designator CON?  (value not drawn)
2.54 mm; Note: Connector; Temp.Characteristic: -40C to +85C; Value: *; Publisher: Catcatcat Electronics; Website developer: http://catcatcat.d-lan.dp.ua/; Assembly type: Manual Part
footprint PLS-10
pins: 1, 2, 3, 4, 5, 6, 7, 8, 9, 10

## PLS-10R
designator CON?  (value not drawn)
2.54 mm; Note: Connector; Temp.Characteristic: -40C to +85C; Value: *; Publisher: Catcatcat Electronics; Website developer: http://catcatcat.d-lan.dp.ua/; Assembly type: Manual Part
footprint PLS-10R
pins: 1, 2, 3, 4, 5, 6, 7, 8, 9, 10

## PLS-12
designator CON?  (value not drawn)
2.54 mm; Note: Connector; Temp.Characteristic: -40C to +85C; Value: *; Publisher: Catcatcat Electronics; Website developer: http://catcatcat.d-lan.dp.ua/; Assembly type: Manual Part
footprint PLS-12
pins: 1, 2, 3, 4, 5, 6, 7, 8, 9, 10, 11, 12

## PLS-12RP
designator CON?  (value not drawn)
2.54 mm; Note: Connector; Temp.Characteristic: -40C to +85C; Value: *; Publisher: Catcatcat Electronics; Website developer: http://catcatcat.d-lan.dp.ua/; Assembly type: Manual Part
footprint PLS-12RP
pins: 1, 2, 3, 4, 5, 6, 7, 8, 9, 10, 11, 12